# Altium footprint library Mechanical_Old.PcbLib: 125 footprints (part 1 of 8)
Each footprint in its own frame and in the unit in brackets; x right, y up, seen from the top. Pads: shape width x height; smd on the part's side, far side on the other; paste and mask are expansions set on the pad; w line width, h text height; cw(c..) or ccw(c..) is an arc to the next point about the centre after c.
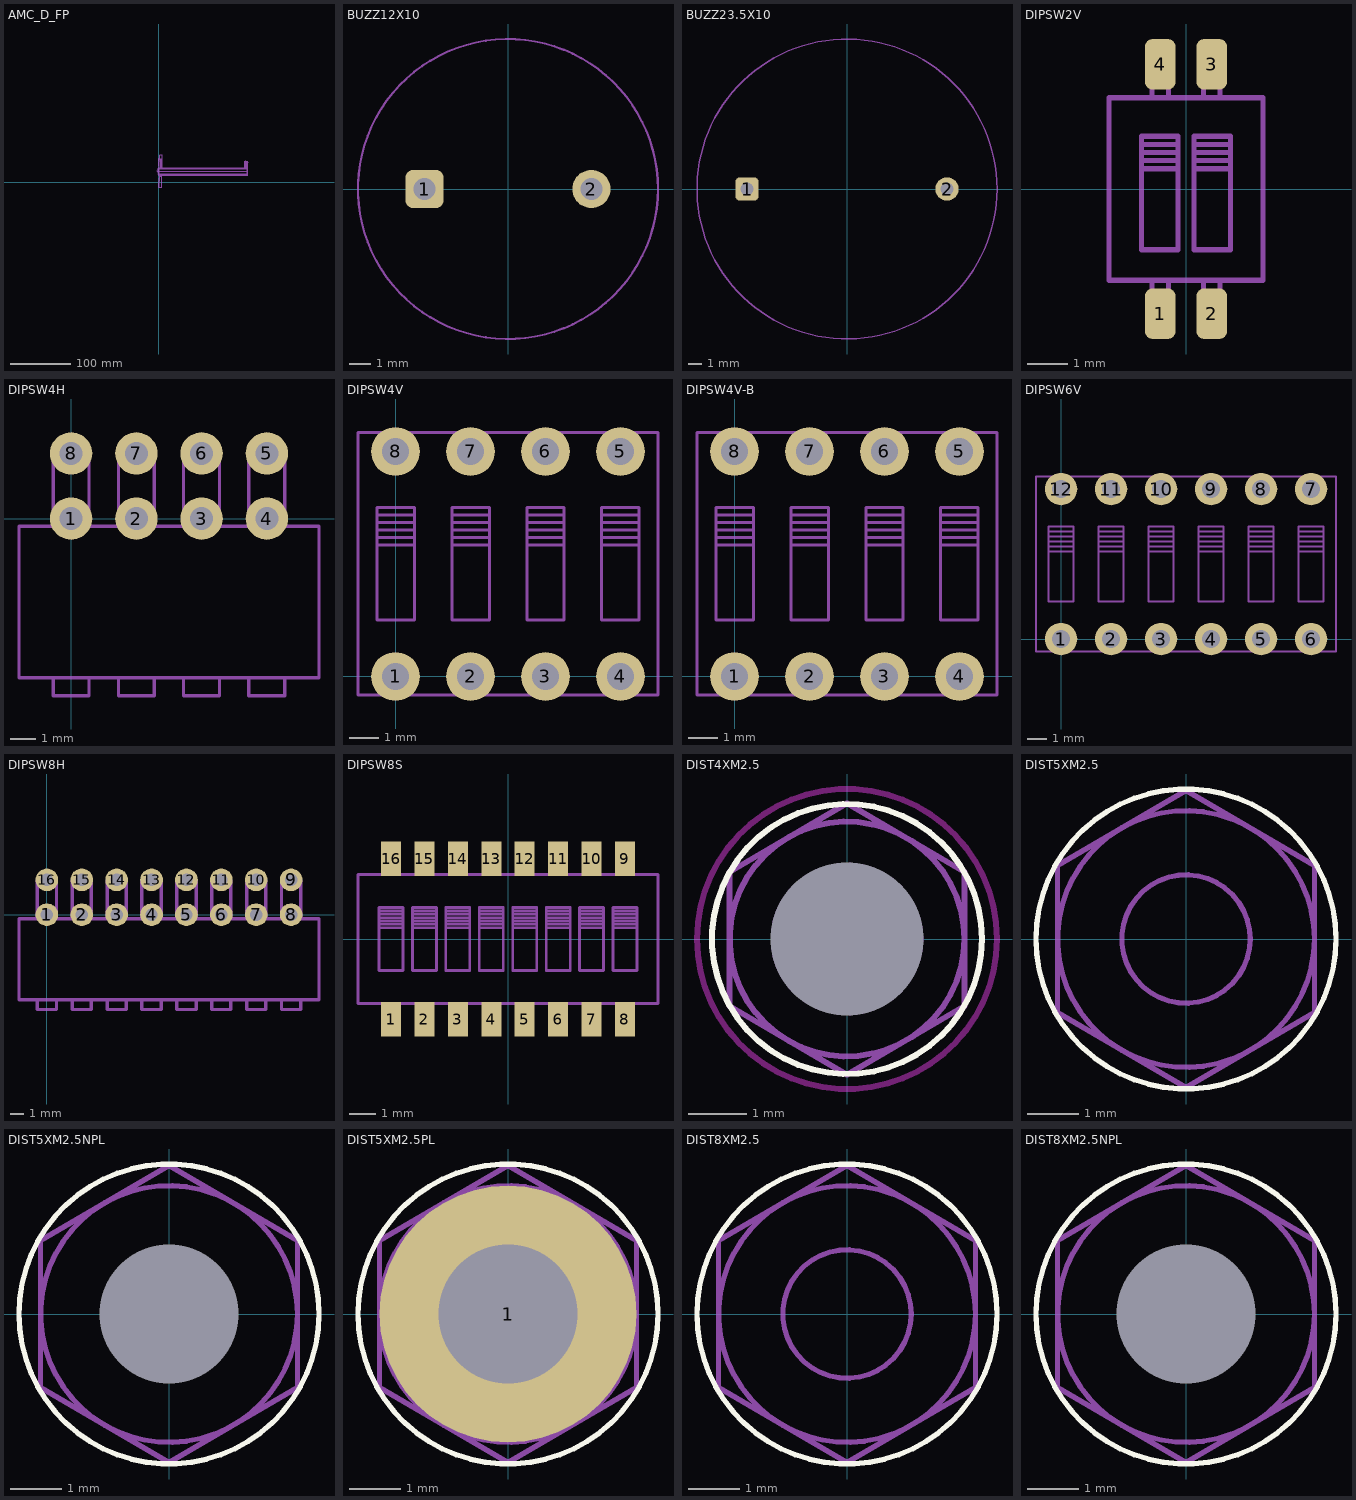
[diagram p0: the footprints below, top view; thin cyan lines are the x and y axes]

## AMC_D_FP [mm]
height 18.9
Mechanical 13:
  drawing of 671 lines, arcs and shapes, not listed
Mechanical 15:
  lines w0.102: 145.135,33 147.065,33 ; 146.1,32.035 146.1,33.965
3D body: height 15.71, standoff -5.35, extent -2.5,-8.351 148.593,45.851

## BUZZ12X10 [mm] "Buzzer D12x10mm"
pads (2):
  rrect40% 1.75x1.75 hole 1: 1(-3.81,0)
  round 1.75 hole 1: 2(3.81,0)
Mechanical 13:
  circle w0.1: c0,0 r6.85
3D body: height 10, standoff 0, extent -6.823,-6.823 6.823,6.85
3D body: height 10.01, standoff 10, extent -5.025,-1.2 -2.625,1.2
3D body: height 0, standoff -3, extent -4.15,-0.349 -3.453,0.349
3D body: height 0, standoff -3, extent 3.453,-0.349 4.15,0.349

## BUZZ23.5X10 [mm] "Buzzer D23.5x10mm"
pads (2):
  rrect40% 1.75x1.75 hole 1: 1(-7.5,0)
  round 1.75 hole 1: 2(7.5,0)
Mechanical 13:
  circle w0.1: c0,0 r11.25
3D body: height 10, standoff 0, extent -11.25,-11.25 11.161,11.206
3D body: height 10.01, standoff 10, extent -8.7,-1.2 -6.3,1.2
3D body: height 0, standoff -3, extent -7.9,-0.4 -7.103,0.398
3D body: height 0, standoff -3, extent 7.1,-0.4 7.897,0.398

## DIPSW2V [mm] "Dip switch 2 position vertical R1.27mm SMD"
height 1.5
pads (4):
  rrect50% 0.76x1.25 smd: 1(-0.635,-3.075) 2(0.635,-3.075) 3(0.635,3.075) 4(-0.635,3.075)
Mechanical 13:
  lines w0.127: -1.1,0.5 -0.2,0.5 ; -1.1,0.7 -0.2,0.7 ; -1.1,0.9 -0.2,0.9 ; -1.1,1.1 -0.2,1.1 ; -0.835,-2.25 -0.835,-3.35 -0.435,-3.35 -0.435,-2.25 ; -0.835,2.25 -0.835,3.35 -0.435,3.35 -0.435,2.25 ; 0.2,0.5 1.1,0.5 ; 0.2,0.7 1.1,0.7 ; 0.2,0.9 1.1,0.9 ; 0.2,1.1 1.1,1.1 ; 0.435,-2.25 0.435,-3.35 0.835,-3.35 0.835,-2.25 ; 0.435,2.25 0.435,3.35 0.835,3.35 0.835,2.25 ; -1.9,-2.25 -1.9,2.25 1.9,2.25 1.9,-2.25 -1.9,-2.25 ; -1.1,-1.5 -1.1,1.3 -0.2,1.3 -0.2,-1.5 -1.1,-1.5 ; 0.2,-1.5 0.2,1.3 1.1,1.3 1.1,-1.5 0.2,-1.5
3D body: height 1.4, standoff 0, extent -1.9,-2.25 1.9,2.25
3D body: height 1.5, standoff 1.4, extent -1.1,0.5 -0.2,1.3
3D body: height 1.5, standoff 1.4, extent 0.2,0.5 1.1,1.3
3D body: height 0.4, standoff 0, extent -0.835,-3.35 -0.435,-2.25
3D body: height 0.4, standoff 0, extent 0.435,-3.35 0.835,-2.25
3D body: height 0.4, standoff 0, extent 0.435,2.25 0.835,3.35
3D body: height 0.4, standoff 0, extent -0.835,2.25 -0.435,3.35

## DIPSW4H [mil] "Dip switch 4 position horizontal R2.54mm"
height 389.76
pads (8):
  round 65 hole 35.43: 1(0,0) 2(100,0) 3(200,0) 4(300,0) 5(300,100) 6(200,100) 7(100,100) 8(0,100)
Mechanical 13:
  lines w5: -27.56,-244.09 -27.56,-271.65 27.56,-271.65 27.56,-244.09 ; -27.56,-11.81 -27.56,98.43 27.56,98.43 27.56,-11.81 ; 72.44,-244.09 72.44,-271.65 127.56,-271.65 127.56,-244.09 ; 72.44,-11.81 72.44,98.43 127.56,98.43 127.56,-11.81 ; 172.44,-244.09 172.44,-271.65 227.56,-271.65 227.56,-244.09 ; 172.44,-11.81 172.44,98.43 227.56,98.43 227.56,-11.81 ; 272.44,-244.09 272.44,-271.65 327.56,-271.65 327.56,-244.09 ; 272.44,-11.81 272.44,98.43 327.56,98.43 327.56,-11.81 ; -79.92,-244.09 380,-244.09 380,-11.81 -79.92,-11.81 -79.92,-244.09
3D body: height 39.37, standoff 19.68, extent 285,-11.81 315,0.15
3D body: height 39.37, standoff 19.68, extent 185,-11.81 215,0.15
3D body: height 39.37, standoff 19.68, extent 85,-11.81 115,0.15
3D body: height 39.37, standoff 19.68, extent -15,-11.81 15,0.15
3D body: height 39.37, standoff 0, extent 284.75,-15.44 315.94,15.75
3D body: height 39.37, standoff 0, extent 184.75,-15.44 215.94,15.75
3D body: height 39.37, standoff 0, extent 84.75,-15.44 115.94,15.75
3D body: height 39.37, standoff 0, extent -15.25,-15.44 15.94,15.75
3D body: height 370.08, standoff 350.39, extent 285.05,-11.81 315,100.15
3D body: height 370.08, standoff 350.39, extent 185.05,-11.81 215,100.15
3D body: height 370.08, standoff 350.39, extent 85.05,-11.81 115,100.15
3D body: height 370.08, standoff 350.39, extent -14.95,-11.81 15,100.15
3D body: height 370.08, standoff 0, extent 284.75,84.56 315.94,115.75
3D body: height 370.08, standoff 0, extent 184.75,84.56 215.94,115.75
3D body: height 370.08, standoff 0, extent 84.75,84.56 115.94,115.75
3D body: height 370.08, standoff 0, extent -15.25,84.56 15.94,115.75
3D body: height 188.98, standoff 125.98, extent 272.44,-271.65 327.56,-224.41
3D body: height 188.98, standoff 125.98, extent 172.44,-271.65 227.56,-224.41
3D body: height 188.98, standoff 125.98, extent 72.44,-271.65 127.56,-224.41
3D body: height 188.98, standoff 125.98, extent -27.56,-271.65 27.56,-224.41
3D body: height 389.76, standoff 263.78, extent -79.92,-244.09 380,-11.81
3D body: height 263.78, standoff 125.98, extent -79.92,-244.09 380,-11.81
3D body: height 125.98, standoff 0, extent -79.92,-244.09 380,-11.81
3D body: height 0, standoff -137.8, extent -14.95,-15.14 15.64,15.45
3D body: height 0, standoff -137.8, extent 85.05,-15.14 115.64,15.45
3D body: height 0, standoff -137.8, extent 185.05,-15.14 215.64,15.45
3D body: height 0, standoff -137.8, extent 285.05,-15.14 315.64,15.45
3D body: height 0, standoff -137.8, extent 285.05,84.86 315.64,115.45
3D body: height 0, standoff -137.8, extent 185.05,84.86 215.64,115.45
3D body: height 0, standoff -137.8, extent 85.05,84.86 115.64,115.45
3D body: height 0, standoff -137.8, extent -14.95,84.86 15.64,115.45

## DIPSW4V [mil] "Dip switch 4 position vertical R2.54mm"
height 314.96
pads (8):
  round 65 hole 35.43 unplated: 1(0,0) 2(100,0) 3(200,0) 4(300,0) 5(300,300) 6(200,300) 7(100,300) 8(0,300)
Mechanical 13:
  lines w4: -25,175 25,175 ; -25,185 25,185 ; -25,195 25,195 ; -25,205 25,205 ; -25,215 25,215 ; 75,175 125,175 ; 75,185 125,185 ; 75,195 125,195 ; 75,205 125,205 ; 75,215 125,215 ; 175,175 225,175 ; 175,185 225,185 ; 175,195 225,195 ; 175,205 225,205 ; 175,215 225,215 ; 275,175 325,175 ; 275,185 325,185 ; 275,195 325,195 ; 275,205 325,205 ; 275,215 325,215 ; -50,-25 350,-25 350,325 -50,325 -50,-25 ; -25,75 25,75 25,225 -25,225 -25,75 ; 75,75 75,225 125,225 125,75 75,75 ; 175,75 175,225 225,225 225,75 175,75 ; 275,75 275,225 325,225 325,75 275,75
3D body: height 277.56, standoff 275.59, extent -14,11 3,64
3D body: height 0, standoff -137.8, extent -15.29,284.71 15.29,315.29
3D body: height 0, standoff -137.8, extent 84.71,284.71 115.29,315.29
3D body: height 0, standoff -137.8, extent 184.71,284.71 215.29,315.29
3D body: height 0, standoff -137.8, extent 284.71,284.71 315.29,315.29
3D body: height 0, standoff -137.8, extent 284.71,-15.29 315.29,15.29
3D body: height 0, standoff -137.8, extent 184.71,-15.29 215.29,15.29
3D body: height 0, standoff -137.8, extent 84.71,-15.29 115.29,15.29
3D body: height 0, standoff -137.8, extent -15.29,-15.29 15.29,15.29
3D body: height 314.96, standoff 236.22, extent 275,175 325,225
3D body: height 314.96, standoff 236.22, extent 175,175 225,225
3D body: height 314.96, standoff 236.22, extent 75,175 125,225
3D body: height 314.96, standoff 236.22, extent -25,175 25,225
3D body: height 275.59, standoff 236.22, extent -50,150 350,325
3D body: height 275.59, standoff 236.22, extent -50,-25 350,150
3D body: height 236.22, standoff 0, extent -50,-25 350,325
3D body: height 240.16, standoff 236.22, extent -25,75 25,175
3D body: height 240.16, standoff 236.22, extent 75,75 125,175
3D body: height 240.16, standoff 236.22, extent 175,75 225,175
3D body: height 240.16, standoff 236.22, extent 275,75 325,175

## DIPSW4V-B [mil] "Dip switch 4 position vertical R2.54mm"
height 314.96
pads (8):
  round 65 hole 35.43 unplated: 1(0,0) 2(100,0) 3(200,0) 4(300,0) 5(300,300) 6(200,300) 7(100,300) 8(0,300)
Mechanical 13:
  lines w4: -25,175 25,175 ; -25,185 25,185 ; -25,195 25,195 ; -25,205 25,205 ; -25,215 25,215 ; 75,175 125,175 ; 75,185 125,185 ; 75,195 125,195 ; 75,205 125,205 ; 75,215 125,215 ; 175,175 225,175 ; 175,185 225,185 ; 175,195 225,195 ; 175,205 225,205 ; 175,215 225,215 ; 275,175 325,175 ; 275,185 325,185 ; 275,195 325,195 ; 275,205 325,205 ; 275,215 325,215 ; -50,-25 350,-25 350,325 -50,325 -50,-25 ; -25,75 25,75 25,225 -25,225 -25,75 ; 75,75 75,225 125,225 125,75 75,75 ; 175,75 175,225 225,225 225,75 175,75 ; 275,75 275,225 325,225 325,75 275,75
3D body: height 598.82, standoff 598.43, extent -14,11 3,64
3D body: height 354.33, standoff 275.59, extent -15.29,284.71 15.29,315.29
3D body: height 649.61, standoff 551.18, extent -25,175 25,225
3D body: height 598.43, standoff 551.18, extent -50,150 350,325
3D body: height 598.43, standoff 551.18, extent -50,-25 350,150
3D body: height 551.18, standoff 354.33, extent -50,-25 350,325
3D body: height 555.12, standoff 551.18, extent -25,75 25,175
3D body: height 354.33, standoff 275.59, extent 84.71,284.71 115.29,315.29
3D body: height 354.33, standoff 275.59, extent 184.71,284.71 215.29,315.29
3D body: height 354.33, standoff 275.59, extent 284.71,284.71 315.29,315.29
3D body: height 354.33, standoff 275.59, extent -15.29,-15.29 15.29,15.29
3D body: height 354.33, standoff 275.59, extent 84.71,-15.29 115.29,15.29
3D body: height 354.33, standoff 275.59, extent 184.71,-15.29 215.29,15.29
3D body: height 354.33, standoff 275.59, extent 284.71,-15.29 315.3,15.3
3D body: height 555.12, standoff 551.18, extent 75,75 125,175
3D body: height 649.61, standoff 551.18, extent 75,175 125,225
3D body: height 555.12, standoff 551.18, extent 175,75 225,175
3D body: height 649.61, standoff 551.18, extent 175,175 225,225
3D body: height 555.12, standoff 551.18, extent 275,75 325,175
3D body: height 649.61, standoff 551.18, extent 275,175 325,225

## DIPSW6V [mil] "Dip switch 6 position vertical R2.54mm"
height 314.96
pads (12):
  round 65 hole 35.43: 1(0,0) 2(100,0) 3(200,0) 4(300,0) 5(400,0) 6(500,0) 7(500,300) 8(400,300) 9(300,300) 10(200,300) 11(100,300) 12(0,300)
Mechanical 13:
  lines w4: -25,175 25,175 ; -25,185 25,185 ; -25,195 25,195 ; -25,205 25,205 ; -25,215 25,215 ; 75,175 125,175 ; 75,185 125,185 ; 75,195 125,195 ; 75,205 125,205 ; 75,215 125,215 ; 175,175 225,175 ; 175,185 225,185 ; 175,195 225,195 ; 175,205 225,205 ; 175,215 225,215 ; 275,175 325,175 ; 275,185 325,185 ; 275,195 325,195 ; 275,205 325,205 ; 275,215 325,215 ; 375,175 425,175 ; 375,185 425,185 ; 375,195 425,195 ; 375,205 425,205 ; 375,215 425,215 ; 475,175 525,175 ; 475,185 525,185 ; 475,195 525,195 ; 475,205 525,205 ; 475,215 525,215 ; -50,-25 -50,325 550,325 550,-25 -50,-25 ; -25,75 -25,225 25,225 25,75 -25,75 ; 75,75 125,75 125,225 75,225 75,75 ; 175,75 225,75 225,225 175,225 175,75 ; 275,75 325,75 325,225 275,225 275,75 ; 375,75 375,225 425,225 425,75 375,75 ; 475,75 475,225 525,225 525,75 475,75
3D body: height 275.59, standoff 236.22, extent -50,150 550,325
3D body: height 0, standoff -137.8, extent 384.71,284.71 415.29,315.29
3D body: height 0, standoff -137.8, extent 484.71,284.71 515.29,315.29
3D body: height 0, standoff -137.8, extent 484.71,-15.29 515.29,15.29
3D body: height 0, standoff -137.8, extent 384.71,-15.29 415.29,15.29
3D body: height 314.96, standoff 236.22, extent 475,175 525,225
3D body: height 314.96, standoff 236.22, extent 375,175 425,225
3D body: height 240.16, standoff 236.22, extent 375,75 425,175
3D body: height 240.16, standoff 236.22, extent 475,75 525,175
3D body: height 240.16, standoff 236.22, extent 275,75 325,175
3D body: height 240.16, standoff 236.22, extent 175,75 225,175
3D body: height 240.16, standoff 236.22, extent 75,75 125,175
3D body: height 240.16, standoff 236.22, extent -25,75 25,175
3D body: height 236.22, standoff 0, extent -50,-25 550,325
3D body: height 275.59, standoff 236.22, extent -50,-25 550,150
3D body: height 314.96, standoff 236.22, extent -25,175 25,225
3D body: height 314.96, standoff 236.22, extent 75,175 125,225
3D body: height 314.96, standoff 236.22, extent 175,175 225,225
3D body: height 314.96, standoff 236.22, extent 275,175 325,225
3D body: height 0, standoff -137.8, extent -15.29,-15.29 15.29,15.29
3D body: height 0, standoff -137.8, extent 84.71,-15.29 115.29,15.29
3D body: height 0, standoff -137.8, extent 184.71,-15.29 215.29,15.29
3D body: height 0, standoff -137.8, extent 284.71,-15.29 315.29,15.29
3D body: height 0, standoff -137.8, extent 284.71,284.71 315.29,315.29
3D body: height 0, standoff -137.8, extent 184.71,284.71 215.29,315.29
3D body: height 0, standoff -137.8, extent 84.71,284.71 115.29,315.29
3D body: height 0, standoff -137.8, extent -15.29,284.71 15.29,315.29
3D body: height 277.56, standoff 275.59, extent -14,11 3,64

## DIPSW8H [mil] "Dip switch 8 position horizontal R2.54mm"
height 389.76
pads (16):
  round 65 hole 35.43 unplated: 1(0,0) 2(100,0) 3(200,0) 4(300,0) 5(400,0) 6(500,0) 7(600,0) 8(700,0) 9(700,100) 10(600,100) 11(500,100) 12(400,100) 13(300,100) 14(200,100) 15(100,100) 16(0,100)
Mechanical 13:
  lines w10: -27.56,-244.09 -27.56,-271.65 27.56,-271.65 27.56,-244.09 ; -27.56,-11.81 -27.56,98.43 27.56,98.43 27.56,-11.81 ; 72.44,-244.09 72.44,-271.65 127.56,-271.65 127.56,-244.09 ; 72.44,-11.81 72.44,98.43 127.56,98.43 127.56,-11.81 ; 172.44,-244.09 172.44,-271.65 227.56,-271.65 227.56,-244.09 ; 172.44,-11.81 172.44,98.43 227.56,98.43 227.56,-11.81 ; 272.44,-244.09 272.44,-271.65 327.56,-271.65 327.56,-244.09 ; 272.44,-11.81 272.44,98.43 327.56,98.43 327.56,-11.81 ; 372.44,-244.09 372.44,-271.65 427.56,-271.65 427.56,-244.09 ; 372.44,-11.81 372.44,98.43 427.56,98.43 427.56,-11.81 ; 472.44,-244.09 472.44,-271.65 527.56,-271.65 527.56,-244.09 ; 472.44,-11.81 472.44,98.43 527.56,98.43 527.56,-11.81 ; 572.44,-244.09 572.44,-271.65 627.56,-271.65 627.56,-244.09 ; 572.44,-11.81 572.44,98.43 627.56,98.43 627.56,-11.81 ; 672.44,-244.09 672.44,-271.65 727.56,-271.65 727.56,-244.09 ; 672.44,-11.81 672.44,98.43 727.56,98.43 727.56,-11.81 ; -79.92,-244.09 779.92,-244.09 779.92,-11.81 -79.92,-11.81 -79.92,-244.09
3D body: height 39.37, standoff 19.68, extent 685,-11.81 715,0.15
3D body: height 39.37, standoff 19.68, extent 585,-11.81 615,0.15
3D body: height 39.37, standoff 19.68, extent 485,-11.81 515,0.15
3D body: height 39.37, standoff 19.68, extent 385,-11.81 415,0.15
3D body: height 39.37, standoff 19.68, extent 285,-11.81 315,0.15
3D body: height 39.37, standoff 19.68, extent 185,-11.81 215,0.15
3D body: height 39.37, standoff 19.68, extent 85,-11.81 115,0.15
3D body: height 39.37, standoff 19.68, extent -15,-11.81 15,0.15
3D body: height 370.08, standoff 350.39, extent 685.05,-11.81 715,100.15
3D body: height 370.08, standoff 350.39, extent 585.05,-11.81 615,100.15
3D body: height 39.37, standoff 0, extent 684.75,-15.44 715.94,15.75
3D body: height 39.37, standoff 0, extent 584.75,-15.44 615.94,15.75
3D body: height 39.37, standoff 0, extent 484.75,-15.44 515.94,15.75
3D body: height 39.37, standoff 0, extent 384.75,-15.44 415.94,15.75
3D body: height 39.37, standoff 0, extent 284.75,-15.44 315.94,15.75
3D body: height 39.37, standoff 0, extent 184.75,-15.44 215.94,15.75
3D body: height 39.37, standoff 0, extent 84.75,-15.44 115.94,15.75
3D body: height 39.37, standoff 0, extent -15.25,-15.44 15.94,15.75
3D body: height 370.08, standoff 350.39, extent 485.05,-11.81 515,100.15
3D body: height 370.08, standoff 350.39, extent 385.05,-11.81 415,100.15
3D body: height 370.08, standoff 350.39, extent 285.05,-11.81 315,100.15
3D body: height 370.08, standoff 350.39, extent 185.05,-11.81 215,100.15
3D body: height 370.08, standoff 350.39, extent 85.05,-11.81 115,100.15
3D body: height 370.08, standoff 350.39, extent -14.95,-11.81 15,100.15
3D body: height 370.08, standoff 0, extent 684.75,84.56 715.94,115.75
3D body: height 370.08, standoff 0, extent 584.75,84.56 615.94,115.75
3D body: height 370.08, standoff 0, extent 484.75,84.56 515.94,115.75
3D body: height 370.08, standoff 0, extent 384.75,84.56 415.94,115.75
3D body: height 370.08, standoff 0, extent 284.75,84.56 315.94,115.75
3D body: height 370.08, standoff 0, extent 184.75,84.56 215.94,115.75
3D body: height 370.08, standoff 0, extent 84.75,84.56 115.94,115.75
3D body: height 370.08, standoff 0, extent -15.25,84.56 15.94,115.75
3D body: height 188.98, standoff 125.98, extent 672.44,-271.65 727.56,-224.41
3D body: height 188.98, standoff 125.98, extent 572.44,-271.65 627.56,-224.41
3D body: height 188.98, standoff 125.98, extent 472.44,-271.65 527.56,-224.41
3D body: height 188.98, standoff 125.98, extent 372.44,-271.65 427.56,-224.41
3D body: height 188.98, standoff 125.98, extent 272.44,-271.65 327.56,-224.41
3D body: height 188.98, standoff 125.98, extent 172.44,-271.65 227.56,-224.41
3D body: height 188.98, standoff 125.98, extent 72.44,-271.65 127.56,-224.41
3D body: height 188.98, standoff 125.98, extent -27.56,-271.65 27.56,-224.41
3D body: height 389.76, standoff 263.78, extent -79.92,-244.09 779.92,-11.81
3D body: height 263.78, standoff 125.98, extent -79.92,-244.09 779.92,-11.81
3D body: height 125.98, standoff 0, extent -79.92,-244.09 779.92,-11.81
3D body: height 0, standoff -137.8, extent -14.95,-15.14 15.64,15.45
3D body: height 0, standoff -137.8, extent 85.05,-15.14 115.64,15.45
3D body: height 0, standoff -137.8, extent 185.05,-15.14 215.64,15.45
3D body: height 0, standoff -137.8, extent 285.05,-15.14 315.64,15.45
3D body: height 0, standoff -137.8, extent 385.05,-15.14 415.64,15.45
3D body: height 0, standoff -137.8, extent 485.05,-15.14 515.64,15.45
3D body: height 0, standoff -137.8, extent 585.05,-15.14 615.64,15.45
3D body: height 0, standoff -137.8, extent 685.05,-15.14 715.64,15.45
3D body: height 0, standoff -137.8, extent 685.05,84.86 715.64,115.45
3D body: height 0, standoff -137.8, extent 585.05,84.86 615.64,115.45
3D body: height 0, standoff -137.8, extent 485.05,84.86 515.64,115.45
3D body: height 0, standoff -137.8, extent 385.05,84.86 415.64,115.45
3D body: height 0, standoff -137.8, extent 285.05,84.86 315.64,115.45
3D body: height 0, standoff -137.8, extent 185.05,84.86 215.64,115.45
3D body: height 0, standoff -137.8, extent 85.05,84.86 115.64,115.45
3D body: height 0, standoff -137.8, extent -14.95,84.86 15.64,115.45

## DIPSW8S [mil] "Dip switch 8 smd"
pads (16):
  rect 30x52 smd: 1(-175,-120) 2(-125,-120) 3(-75,-120) 4(-25,-120) 5(25,-120) 6(75,-120) 7(125,-120) 8(175,-120) 9(175,120) 10(125,120) 11(75,120) 12(25,120) 13(-25,120) 14(-75,120) 15(-125,120) 16(-175,120)
Mechanical 13:
  lines w4: -193,17 -157,17 ; -193,22 -157,22 ; -193,27 -157,27 ; -193,32 -157,32 ; -193,37 -157,37 ; -193,42 -157,42 ; -143,17 -107,17 ; -143,22 -107,22 ; -143,27 -107,27 ; -143,32 -107,32 ; -143,37 -107,37 ; -143,42 -107,42 ; -93,17 -57,17 ; -93,22 -57,22 ; -93,27 -57,27 ; -93,32 -57,32 ; -93,37 -57,37 ; -93,42 -57,42 ; -43,17 -7,17 ; -43,22 -7,22 ; -43,27 -7,27 ; -43,32 -7,32 ; -43,37 -7,37 ; -43,42 -7,42 ; 7,17 43,17 ; 7,22 43,22 ; 7,27 43,27 ; 7,32 43,32 ; 7,37 43,37 ; 7,42 43,42 ; 57,17 93,17 ; 57,22 93,22 ; 57,27 93,27 ; 57,32 93,32 ; 57,37 93,37 ; 57,42 93,42 ; 107,17 143,17 ; 107,22 143,22 ; 107,27 143,27 ; 107,32 143,32 ; 107,37 143,37 ; 107,42 143,42 ; 157,17 193,17 ; 157,22 193,22 ; 157,27 193,27 ; 157,32 193,32 ; 157,37 193,37 ; 157,42 193,42 ; -224.41,-96.46 -224.41,96.46 224.41,96.46 224.41,-96.46 -224.41,-96.46 ; -193,-47.24 -193,47.24 -157,47.24 -157,-47.24 -193,-47.24 ; -143,-47.24 -107,-47.24 -107,47.24 -143,47.24 -143,-47.24 ; -93,-47.24 -57,-47.24 -57,47.24 -93,47.24 -93,-47.24 ; -43,-47.24 -7,-47.24 -7,47.24 -43,47.24 -43,-47.24 ; 7,-47.24 43,-47.24 43,47.24 7,47.24 7,-47.24 ; 57,-47.24 93,-47.24 93,47.24 57,47.24 57,-47.24 ; 107,-47.24 143,-47.24 143,47.24 107,47.24 107,-47.24 ; 157,-47.24 193,-47.24 193,47.24 157,47.24 157,-47.24
  text "1" at -180,-90 h35.43
  text "ON" at -207,54 h35
  text "2" at -135,-90 h35.43
  text "3" at -85,-90 h35.43
  text "4" at -35,-90 h35.43
  text "5" at 15,-90 h35.43
  text "6" at 60,-90 h35.43
  text "7" at 115,-90 h35.43
  text "8" at 165,-90 h35.43
3D body: height 59.06, standoff 0, extent -224.41,0 224.41,96.46
3D body: height 59.06, standoff 0, extent -224.41,-96.46 224.41,0
3D body: height 47.24, standoff 0, extent -193,-47.24 -157,15
3D body: height 74.8, standoff 0, extent -193,17 -157,47.24
3D body: height 74.8, standoff 0, extent -143,17 -107,47.24
3D body: height 47.24, standoff 0, extent -143,-47.24 -107,15
3D body: height 74.8, standoff 0, extent -93,17 -57,47.24
3D body: height 47.24, standoff 0, extent -93,-47.24 -57,15
3D body: height 74.8, standoff 0, extent -43,17 -7,47.24
3D body: height 47.24, standoff 0, extent -43,-47.24 -7,15
3D body: height 74.8, standoff 0, extent 7,17 43,47.24
3D body: height 47.24, standoff 0, extent 7,-47.24 43,15
3D body: height 74.8, standoff 0, extent 57,17 93,47.24
3D body: height 47.24, standoff 0, extent 57,-47.24 93,15
3D body: height 74.8, standoff 0, extent 107,17 143,47.24
3D body: height 47.24, standoff 0, extent 107,-47.24 143,15
3D body: height 74.8, standoff 0, extent 157,17 193,47.24
3D body: height 47.24, standoff 0, extent 157,-47.24 193,15

## DIST4XM2.5 [mm] "Distancnik 4mm M2.5"
pads (1):
  round 0 hole 2.6 unplated: 0(0,0)
Top Layer keep-out:
  circle w0.102: c0,0 r2.555
Top Overlay:
  circle w0.102: c0,0 r2.3
Top Solder:
  circle w2.54: c0,0 r1.27
Bottom Solder:
  circle w2.54: c0,0.025 r1.27
Mechanical 13:
  circle w0.102: c0,0 r1.25
  circle w0.102: c0,0 r2
  lines w0.102: -2,-1.143 -2,1.143 0,2.311 2,1.143 2,-1.143 0,-2.311 -2,-1.143
3D body: height 10.4, standoff 0, extent -2,-2.311 2,2.311

## DIST5XM2.5 [mm] "Standoff SW5mm M2.5 no hole"
height 5
Top Overlay:
  circle w0.102: c0,0 r2.921
Mechanical 13:
  circle w0.102: c0,0 r2.5
  circle w0.102: c0,0 r1.25
  lines w0.102: -2.5,-1.432 -2.5,1.432 0,2.893 2.5,1.432 2.5,-1.432 0,-2.893 -2.5,-1.432
3D body: height 5, standoff 0, extent -2.5,-2.893 2.5,2.893

## DIST5XM2.5NPL [mm] "Standoff SW5mm M2.5 nonplated hole"
height 5
pads (1):
  round 0 hole 2.7 unplated mask+2.7: 1(0,0)
Top Overlay:
  circle w0.102: c0,0 r2.921
Mechanical 13:
  circle w0.102: c0,0 r2.5
  circle w0.102: c0,0 r1.25
  lines w0.102: -2.5,-1.432 -2.5,1.432 0,2.893 2.5,1.432 2.5,-1.432 0,-2.893 -2.5,-1.432
3D body: height 5, standoff 0, extent -2.5,-2.893 2.5,2.893

## DIST5XM2.5PL [mm] "Standoff SW5mm M2.5 plated hole"
height 5
pads (1):
  round 5 hole 2.7 mask+0.2: 1(0,0)
Top Overlay:
  circle w0.102: c0,0 r2.921
Mechanical 13:
  circle w0.102: c0,0 r1.25
  circle w0.102: c0,0 r2.5
  lines w0.102: -2.5,-1.432 0,-2.893 2.5,-1.432 2.5,1.432 0,2.893 -2.5,1.432 -2.5,-1.432
3D body: height 5, standoff 0, extent -2.5,-2.893 2.5,2.893

## DIST8XM2.5 [mm] "Standoff SW5mm M2.5 no hole"
height 8
Top Overlay:
  circle w0.102: c0,0 r2.921
Mechanical 13:
  circle w0.102: c0,0 r2.5
  circle w0.102: c0,0 r1.25
  lines w0.102: -2.5,-1.432 -2.5,1.432 0,2.893 2.5,1.432 2.5,-1.432 0,-2.893 -2.5,-1.432
3D body: height 8, standoff 0, extent -2.5,-2.893 2.5,2.893

## DIST8XM2.5NPL [mm] "Standoff SW5mm M2.5 nonplated hole"
height 8
pads (1):
  round 0 hole 2.7 unplated mask+2.7: 1(0,0)
Top Overlay:
  circle w0.102: c0,0 r2.921
Mechanical 13:
  circle w0.102: c0,0 r2.5
  circle w0.102: c0,0 r1.25
  lines w0.102: -2.5,-1.432 -2.5,1.432 0,2.893 2.5,1.432 2.5,-1.432 0,-2.893 -2.5,-1.432
3D body: height 8, standoff 0, extent -2.5,-2.893 2.5,2.893